# Altium footprint library JL_PCB.PCBLIB: 1129 footprints (part 71 of 72)
Each footprint in its own frame and in the unit in brackets; x right, y up, seen from the top. Pads: shape width x height; smd on the part's side, far side on the other; paste and mask are expansions set on the pad; w line width, h text height; cw(c..) or ccw(c..) is an arc to the next point about the centre after c.
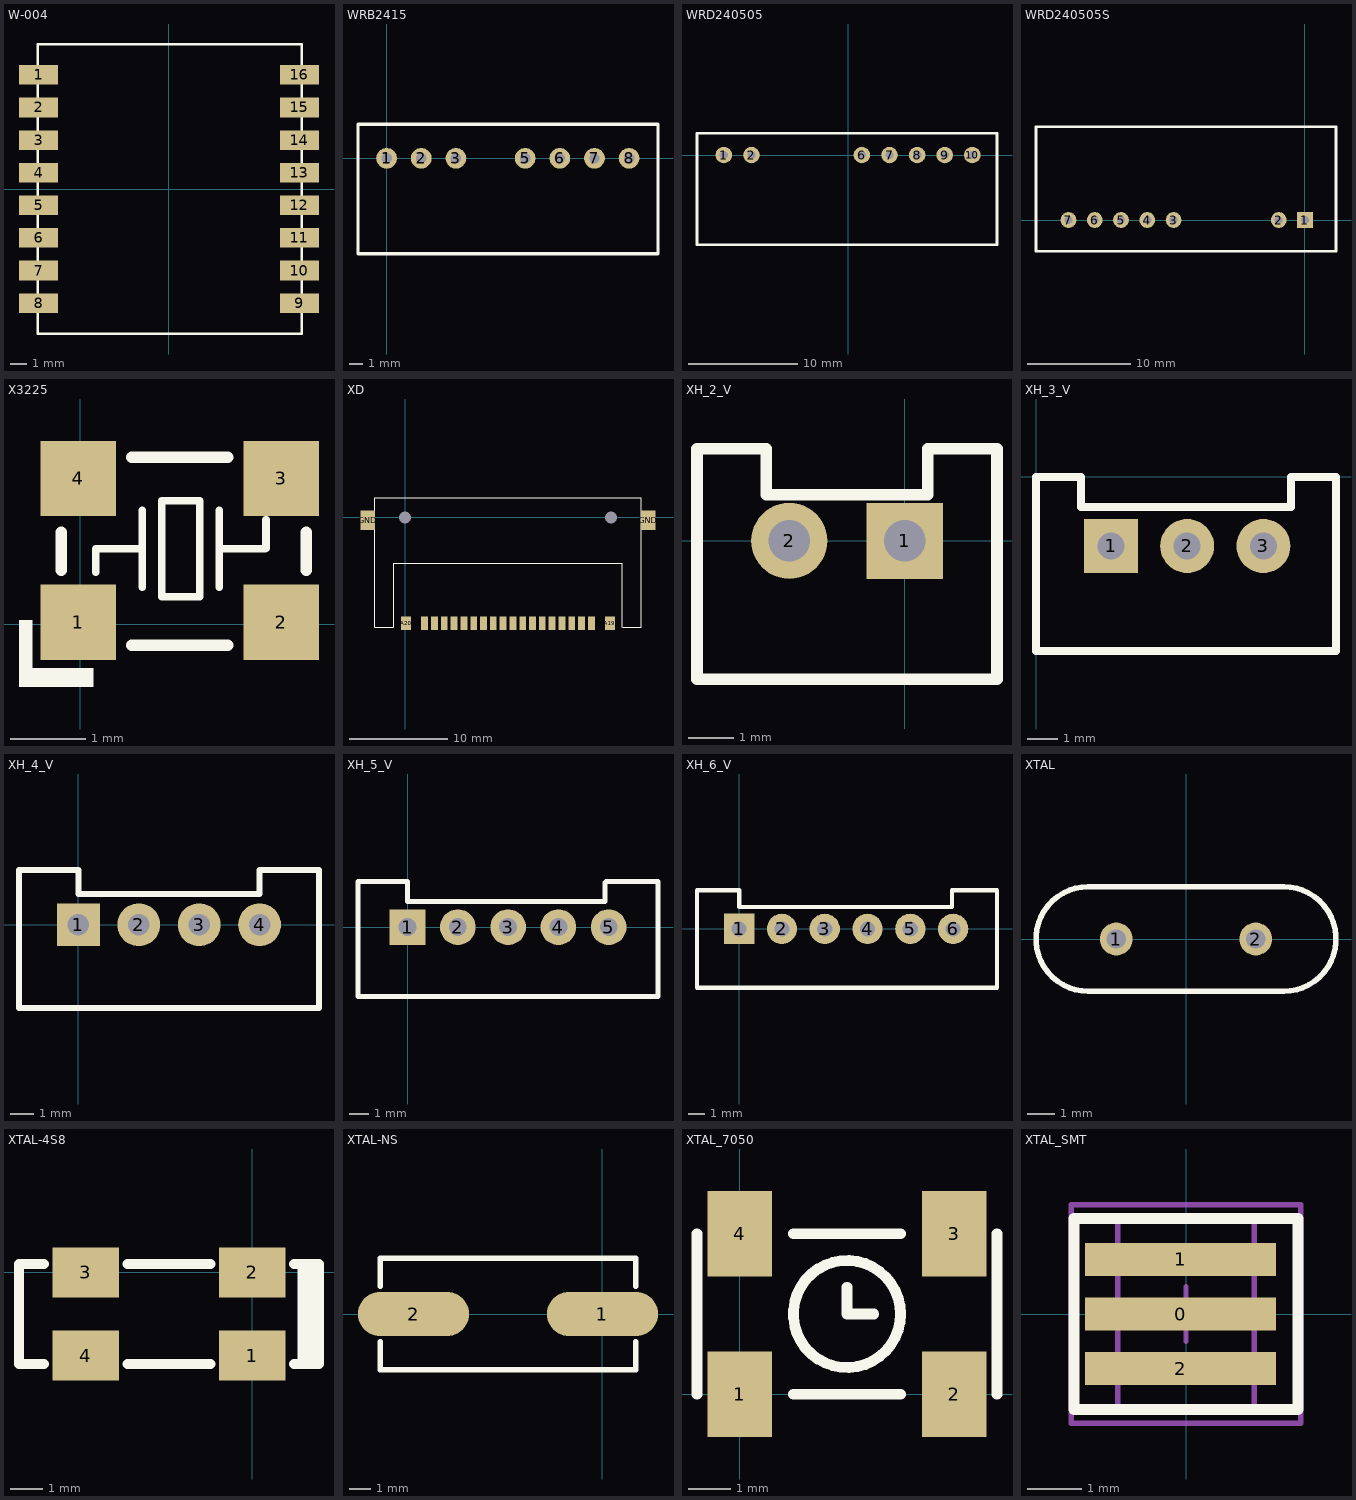
[diagram p70: the footprints below, top view; thin cyan lines are the x and y axes]

## W-004 [mm]
pads (16):
  rect 2.4x1.2 smd: 1(-8,7) 2(-8,5) 3(-8,3) 4(-8,1) 5(-8,-1) 6(-8,-3) 7(-8,-5) 8(-8,-7) 9(8,-7) 10(8,-5) 11(8,-3) 12(8,-1) 13(8,1) 14(8,3) 15(8,5) 16(8,7)
TopOverlay:
  lines w0.152: -8.051,-8.89 -8.051,8.89 8.129,8.89 8.129,-8.89 -8.051,-8.89

## WRB2415 [mil]
pads (7):
  round 60 hole 30: 1(0,0) 2(100,0) 3(200,0) 5(400,0) 6(500,0) 7(600,0) 8(700,0)
TopOverlay:
  lines w10: -82.68,-275.59 783.46,-275.59 783.46,98.43 -82.68,98.43 -82.68,-275.59

## WRD240505 [mil]
pads (7):
  round 60 hole 30: 1(-451,0) 2(-351,0) 6(49,0) 7(149,0) 8(249,0) 9(349,0) 10(449,0)
TopOverlay:
  lines w10: -548.31,-324.8 -548.31,78.74 538.31,78.74 538.31,-324.8 -548.31,-324.8

## WRD240505S [mil]
pads (7):
  rect 60x60 hole 30: 1(0,0)
  round 60 hole 30: 2(-100,0) 3(-500,0) 4(-600,0) 5(-700,0) 6(-800,0) 7(-900,0)
TopOverlay:
  lines w10: -1023.62,-118.11 118.11,-118.11 118.11,0 118.11,314.96 118.11,354.33 78.74,354.33 -984.25,354.33 -1023.62,354.33 -1023.62,-118.11

## X3225 [mil]
pads (4):
  rect 39.37x39.37 smd: 1(-1,1) 2(105,1) 3(105,76) 4(-1,76)
TopOverlay:
  rectangle: -32,-27 -25,2
  rectangle: -32,-33 7,-23
  lines w3.94: 8,27 8,39.31 32.47,39.31 ; 32.47,19.32 32.47,59.31 ; 72.47,19.32 72.47,59.31 ; 72.47,39.31 96.69,39.31 97,39.63 ; 97,40 97,54.37 ; 42.47,14.31 62.47,14.31 62.47,26.82 62.47,51.81 62.47,64.31 42.47,64.31 42.47,14.31
  lines w6: -10,28 -10,48 ; 27,-11 77,-11 ; 27,87 77,87 ; 118,28 118,48
3D body "User Library-X32-3_2x2_5.STEP": height 28.35, standoff 0, extent -8.99,-11.43 116.99,87

## XD [mm]
pads (24):
  round 0 hole 1.2 unplated: 0(21,0) 1(0,0)
  rect 0.7x1.4 smd: A1(19,-10.8) A2(18,-10.8) A3(17,-10.8) A4(16,-10.8) A5(15,-10.8) A6(14,-10.8) A7(13,-10.8) A8(12,-10.8) A9(11,-10.8) A10(10,-10.8) A11(9,-10.8) A12(8,-10.8) A13(7,-10.8) A14(6,-10.8) A15(5,-10.8) A16(4,-10.8) A17(3,-10.8) A18(2,-10.8)
  rect 1x1.4 smd: A19(20.9,-10.8) A20(0.1,-10.8)
  rect 1.5x2 smd: GND(-3.8,-0.3) GND(24.8,-0.3)
TopOverlay:
  lines w0.127: -1.2,-11.19 -3.1,-11.19 -3.1,2.01 24.1,2.01 24.1,-11.19 22.2,-11.19 ; -1.16,-11.19 -1.16,-4.69 22.14,-4.69 22.14,-11.19

## XH_2_V [mil]
pads (2):
  rect 66x66 hole 36: 1(0,0)
  round 66 hole 36: 2(-100,0)
TopOverlay:
  lines w10: -180,-120 -180,80 -120,80 -120,40 20,40 20,80 80,80 80,0 80,-120 -180,-120
3D body "XH-2A.STEP": height 276.19, standoff -133.26, extent -195.67,-133.86 95.67,92.52

## XH_3_V [mm]
height 7
pads (3):
  rect 1.8x1.8 hole 0.9: 1(2.5,-2.3)
  round 1.8 hole 0.9: 2(5.04,-2.3) 3(7.58,-2.3)
TopOverlay:
  lines w0.254: 0,-5.791 0,-5.8 ; 0,-5.8 10,-5.8 10,0 8.5,0 8.5,-1 1.5,-1 1.5,0 0,0 0,-5.8
3D body "XH-3A.STEP": height 7.02, standoff -3.38, extent 0.09,-5.7 9.99,0.05

## XH_4_V [mm]
pads (4):
  rect 1.8x1.8 hole 0.9: 1(0,0)
  round 1.8 hole 0.9: 2(2.54,0) 3(5.08,0) 4(7.62,0)
TopOverlay:
  lines w0.254: -2.5,-3.491 -2.5,-3.5 ; -2.5,-3.5 -2.5,2.3 0,2.3 0,1.3 7.62,1.3 7.62,2.3 10.12,2.3 10.12,-3.5 -2.5,-3.5
3D body "CH2.54-4.STEP": height 7, standoff -3.4, extent -2.39,-3.353 10.01,2.747

## XH_5_V [mm]
pads (5):
  rect 1.8x1.8 hole 0.9: 1(0,0)
  round 1.8 hole 0.9: 2(2.54,0) 3(5.08,0) 4(7.62,0) 5(10.16,0)
TopOverlay:
  lines w0.254: -2.5,-3.491 -2.5,-3.5 ; 9.982,2.263 9.982,1.3 0,1.3 0,2.3 -2.5,2.3 -2.5,-3.5 ; 10.019,2.3 12.638,2.3 12.638,-0.319 ; 12.649,2.3 12.649,-3.5 -2.5,-3.5

## XH_6_V [mm]
pads (6):
  rect 1.8x1.8 hole 0.9: 1(0,0)
  round 1.8 hole 0.9: 2(2.54,0) 3(5.08,0) 4(7.62,0) 5(10.16,0) 6(12.7,0)
TopOverlay:
  lines w0.254: -2.5,-3.491 -2.5,-3.5 ; 12.638,-0.319 12.638,0.335 ; 12.638,1.645 12.638,2.3 12.638,1.3 0,1.3 0,2.3 -2.5,2.3 -2.5,-3.5 ; 12.649,2.3 15.305,2.3 15.305,-0.356 15.305,-3.5 -2.5,-3.5

## XTAL [mm] "Radial Cap, Thru-Hole; 2 Leads; 0.2 in Pin Spacing"
pads (2):
  round 1.2 hole 0.7: 1(-2.54,0) 2(2.54,0)
TopOverlay:
  lines w0.203: -3.556,-1.905 cw(c-3.556,0) -3.556,1.905 3.556,1.905 cw(c3.556,0) 3.556,-1.905 -3.556,-1.905
3D body "XTAL.STEP": height 3.22, standoff -2.41, extent -5.334,-2.054 5.334,2.054

## XTAL-4S8 [mil]
pads (4):
  rect 80x60 smd: 1(0,-100) 2(0,0) 3(-200,0) 4(-200,-100)
TopOverlay:
  lines w12: -250,-110 -280,-110 -280,10 -250,10 ; -150,-110 -50,-110 ; -150,10 -50,10 ; 50,-110 80,-110 80,10 50,10 ; 60,-110 60,10 ; 70,-110 70,10

## XTAL-NS [mil]
pads (2):
  oval 200x80 smd: 1(0,0) 2(-340,0)
TopOverlay:
  lines w10: -400,-50 -400,-100 60,-100 60,-50 ; -400,50 -400,100 60,100 60,50
3D body "User Library-HC49S-SMD.step": height 173.22, standoff 0, extent -433.77,-95.45 93.79,97.46

## XTAL_7050 [mil]
pads (4):
  rect 60x80 smd: 1(0,0) 2(200,0) 3(200,150) 4(0,150)
TopOverlay:
  circle w10: c100,75 r50
  lines w10: -40,0 -40,150 ; 50,0 150,0 ; 50,150 150,150 ; 100,100 100,75 125,75 ; 240,0 240,150
3D body "User Library-VX3-Quartz-Oscillator.STEP": height 73.62, standoff 10.63, extent -37.5,-23.43 238.09,173.43

## XTAL_SMT [mm] "SOT223, 4-Leads, Body 3.5x2.8mm (max), Pitch 1.00mm, IPC Medium Density"
height 1.8
pads (3):
  rect 3.5x0.6 smd: 0(-0.1,0) 1(-0.1,1) 2(-0.1,-1)
TopOverlay:
  lines w0.2: -2.05,-1.75 -2.05,1.75 2.05,1.75 2.05,-1.75 -2.05,-1.75
Mechanical13:
  lines w0.1: -1.25,-1.75 -1.25,1.75 1.25,1.75 1.25,-1.75 -1.25,-1.75
Mechanical15:
  lines w0.1: -0.5,0 0.5,0 ; 0,-0.5 0,0.5 ; -2.1,-2 -2.1,2 2.1,2 2.1,-2 -2.1,-2
3D body: height 1.8, standoff 0.02, extent -1.25,-1.75 1.25,1.75